# Altium footprint library USRP2_Clone.PcbLib: 91 footprints (part 1 of 6)
Each footprint in its own frame and in the unit in brackets; x right, y up, seen from the top. Pads: shape width x height; smd on the part's side, far side on the other; paste and mask are expansions set on the pad; w line width, h text height; cw(c..) or ccw(c..) is an arc to the next point about the centre after c.
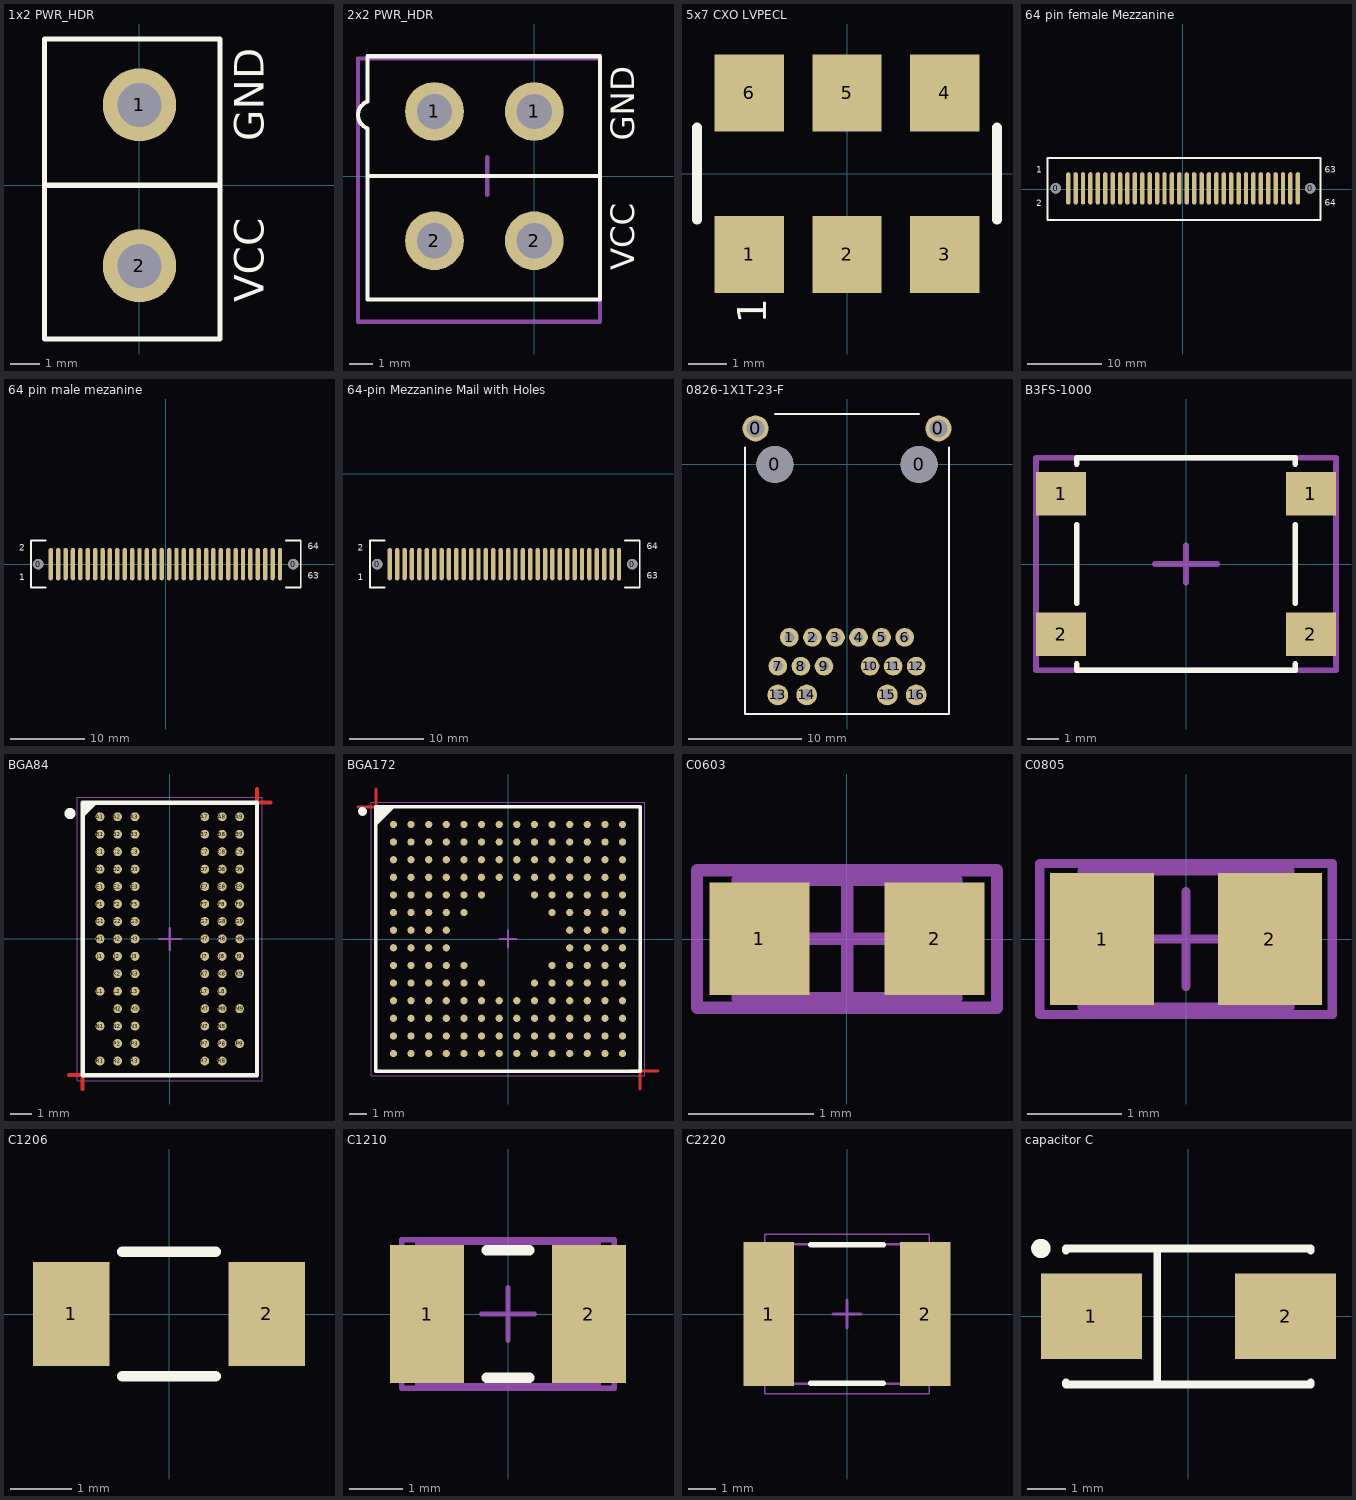
[diagram p0: the footprints below, top view; thin cyan lines are the x and y axes]

## 1x2 PWR_HDR [mm]
height 5
pads (2):
  round 2.5 hole 1.5: 1(0,2.75) 2(0,-2.75)
Top Overlay:
  lines w0.178: -3.25,0 2.75,0 ; -3.25,-5.25 -3.25,5 2.75,5 2.75,-5.25 -3.25,-5.25
  text "GND" at 4.25,1.5 h1.02
  text "VCC" at 4.25,-4 h1.02
3D body "User Library-Con_MF-xxMA.step": height 1.5, standoff -14.8, extent -3.124,-6.16 2.676,4.84

## 2x2 PWR_HDR [mm]
height 5
pads (4):
  round 2.5 hole 1.5: 1(-4.25,2.75) 1(0,2.75) 2(-4.25,-2.75) 2(0,-2.75)
Top Overlay:
  lines w0.178: -7.1,2 -7.1,-5.25 2.8,-5.25 2.8,5.1 -7.1,5.1 -7.1,3.2 ; -7.09,2.031 cw(c-6.9,2.6) -7.09,3.169 ; -7,0 2.8,0
  text "VCC" at 4.25,-4 h1.02
  text "GND" at 4.25,1.5 h1.02
Mechanical 15:
  lines w0.178: -2.7,0 -1.3,0 ; -2,-0.8 -2,0.8 ; -7.5,-6.2 2.8,-6.2 2.8,5 -7.5,5 -7.5,-6.2
3D body "User Library-Con_MF-xxMA (2).step": height 12.8, standoff -3.5, extent -7.35,-6.1 2.65,4.9

## 5x7 CXO LVPECL [mm] "6-pin 5x7 CXO LVPECL"
height 1.8
pads (6):
  rect 1.8x2 smd: 1(-2.54,-2.1) 2(0,-2.1) 3(2.54,-2.1) 4(2.54,2.1) 5(0,2.1) 6(-2.54,2.1)
Top Overlay:
  lines w0.254: -3.9,-1.2 -3.9,1.2 ; 3.9,-1.2 3.9,1.2
  text "1" at -2.1,-3.9 h0.76
3D body "7x5 CXO 6-pin.step": height 1.2, standoff 0, extent -3.502,-2.502 3.502,2.503

## 64 pin female Mezzanine [mm]
pads (66):
  round 1.4 hole 1.4 unplated mask+0: 0(-17.15,0.15) 0(17.225,0.15)
  oval 0.6x3 smd: 1(-15.45,0.825) 3(-14.452,0.832) 5(-13.454,0.832) 7(-12.453,0.832) 9(-11.452,0.832) 11(-10.454,0.832) 13(-9.453,0.832) 15(-8.452,0.832) 17(-7.454,0.832) 19(-6.453,0.832) 21(-5.453,0.832) 23(-4.452,0.832) 25(-3.454,0.832) 27(-2.453,0.832) 29(-1.452,0.832) 31(-0.454,0.832) 33(0.547,0.832) 35(1.548,0.832) 37(2.546,0.832) 39(3.547,0.832) 41(4.547,0.832) 43(5.548,0.832) 45(6.546,0.832) 47(7.547,0.832) 49(8.548,0.832) 51(9.546,0.832) 53(10.547,0.832) 55(11.548,0.832) 57(12.546,0.832) 59(13.547,0.832) 61(14.547,0.832) 63(15.548,0.832)
  oval 0.6x3 smd paste+0: 2(-15.453,-0.547) 4(-14.452,-0.547) 6(-13.454,-0.547) 8(-12.453,-0.547) 10(-11.452,-0.547) 12(-10.454,-0.547) 14(-9.453,-0.547) 16(-8.452,-0.547) 18(-7.454,-0.547) 20(-6.453,-0.547) 22(-5.453,-0.547) 24(-4.452,-0.547) 26(-3.454,-0.547) 28(-2.453,-0.547) 30(-1.452,-0.547) 32(-0.454,-0.547) 34(0.547,-0.547) 36(1.548,-0.547) 38(2.546,-0.547) 40(3.547,-0.547) 42(4.547,-0.547) 44(5.548,-0.547) 46(6.546,-0.547) 48(7.547,-0.547) 50(8.548,-0.547) 52(9.546,-0.547) 54(10.547,-0.547) 56(11.548,-0.547) 58(12.546,-0.547) 60(13.547,-0.547) 62(14.547,-0.547) 64(15.548,-0.547)
Top Overlay:
  lines w0.254: -18.247,-4.128 18.583,-4.128 18.583,4.254 -18.247,4.254 -18.247,-4.128
  text "63" at 19.175,1.95 h1.52
  text "64" at 19.175,-2.55 h1.52
  text "1" at -19.8,1.9 h1.52
  text "2" at -19.8,-2.6 h1.52
3D body "714390164.stp": height 5.31, standoff -0.79, extent -17.899,-2.923 18.001,3.177

## 64 pin male mezanine [mm]
pads (66):
  round 1.4 hole 1.4 unplated mask+0: 0(-17.25,0) 0(17.25,0)
  oval 0.6x3 smd paste+0: 1(-15.553,-0.697) 3(-14.552,-0.697) 5(-13.554,-0.697) 7(-12.553,-0.697) 9(-11.552,-0.697) 11(-10.554,-0.697) 13(-9.553,-0.697) 15(-8.552,-0.697) 17(-7.554,-0.697) 19(-6.553,-0.697) 21(-5.553,-0.697) 23(-4.552,-0.697) 25(-3.554,-0.697) 27(-2.553,-0.697) 29(-1.552,-0.697) 31(-0.554,-0.697) 33(0.447,-0.697) 35(1.448,-0.697) 37(2.446,-0.697) 39(3.447,-0.697) 41(4.447,-0.697) 43(5.448,-0.697) 45(6.446,-0.697) 47(7.447,-0.697) 49(8.448,-0.697) 51(9.446,-0.697) 53(10.447,-0.697) 55(11.448,-0.697) 57(12.446,-0.697) 59(13.447,-0.697) 61(14.447,-0.697) 63(15.448,-0.697)
  oval 0.6x3 smd: 2(-15.55,0.675) 4(-14.552,0.682) 6(-13.554,0.682) 8(-12.553,0.682) 10(-11.552,0.682) 12(-10.554,0.682) 14(-9.553,0.682) 16(-8.552,0.682) 18(-7.554,0.682) 20(-6.553,0.682) 22(-5.553,0.682) 24(-4.552,0.682) 26(-3.554,0.682) 28(-2.553,0.682) 30(-1.552,0.682) 32(-0.554,0.682) 34(0.447,0.682) 36(1.448,0.682) 38(2.446,0.682) 40(3.447,0.682) 42(4.447,0.682) 44(5.448,0.682) 46(6.446,0.682) 48(7.447,0.682) 50(8.448,0.682) 52(9.446,0.682) 54(10.447,0.682) 56(11.448,0.682) 58(12.446,0.682) 60(13.447,0.682) 62(14.447,0.682) 64(15.448,0.682)
Top Overlay:
  lines w0.254: -16.25,-3.175 -18.25,-3.175 -18.25,3.175 -16.25,3.175 ; 16.25,-3.175 18.25,-3.175 18.25,3.175 16.25,3.175
  text "64" at 19.2,1.675 h1.52
  text "63" at 19.2,-2.325 h1.52
  text "2" at -19.85,1.45 h1.52
  text "1" at -19.85,-2.55 h1.52
3D body "714362164.stp": height 8.35, standoff -0.75, extent -17.95,-3.05 17.95,3.05

## 64-pin Mezzanine Mail with Holes [mm]
height 5
pads (66):
  round 1.4 hole 1.4 unplated mask+0: 0(8.35,-12.2) 0(42.85,-12.2)
  oval 0.6x3 smd paste+0: 1(10.047,-12.897) 3(11.048,-12.897) 5(12.046,-12.897) 7(13.047,-12.897) 9(14.048,-12.897) 11(15.046,-12.897) 13(16.047,-12.897) 15(17.048,-12.897) 17(18.046,-12.897) 19(19.047,-12.897) 21(20.047,-12.897) 23(21.048,-12.897) 25(22.046,-12.897) 27(23.047,-12.897) 29(24.048,-12.897) 31(25.046,-12.897) 33(26.047,-12.897) 35(27.048,-12.897) 37(28.046,-12.897) 39(29.047,-12.897) 41(30.047,-12.897) 43(31.048,-12.897) 45(32.046,-12.897) 47(33.047,-12.897) 49(34.048,-12.897) 51(35.046,-12.897) 53(36.047,-12.897) 55(37.048,-12.897) 57(38.046,-12.897) 59(39.047,-12.897) 61(40.047,-12.897) 63(41.048,-12.897)
  oval 0.6x3 smd: 2(10.05,-11.525) 4(11.048,-11.518) 6(12.046,-11.518) 8(13.047,-11.518) 10(14.048,-11.518) 12(15.046,-11.518) 14(16.047,-11.518) 16(17.048,-11.518) 18(18.046,-11.518) 20(19.047,-11.518) 22(20.047,-11.518) 24(21.048,-11.518) 26(22.046,-11.518) 28(23.047,-11.518) 30(24.048,-11.518) 32(25.046,-11.518) 34(26.047,-11.518) 36(27.048,-11.518) 38(28.046,-11.518) 40(29.047,-11.518) 42(30.047,-11.518) 44(31.048,-11.518) 46(32.046,-11.518) 48(33.047,-11.518) 50(34.048,-11.518) 52(35.046,-11.518) 54(36.047,-11.518) 56(37.048,-11.518) 58(38.046,-11.518) 60(39.047,-11.518) 62(40.047,-11.518) 64(41.048,-11.518)
via 0,0 diameter 6 hole 3
via 52.075,10.175 diameter 6 hole 3
via 52.075,-45.725 diameter 6 hole 3
via -10.175,-45.725 diameter 6 hole 3
Top Overlay:
  lines w0.254: 9.35,-15.375 7.35,-15.375 7.35,-9.025 9.35,-9.025 ; 41.85,-15.375 43.85,-15.375 43.85,-9.025 41.85,-9.025
  text "64" at 44.8,-10.525 h1.52
  text "63" at 44.8,-14.525 h1.52
  text "2" at 5.75,-10.75 h1.52
  text "1" at 5.75,-14.75 h1.52
3D body "714362164.stp": height 8.35, standoff -0.75, extent 7.6,-15.25 43.5,-9.15

## 0826-1X1T-23-F [mil] "Gigabit Ethernet Single Port MagJack® with LEDs"
height 536
pads (20):
  round 90 hole 62: 0(-317.5,125) 0(317.5,125)
  round 128 hole 128 unplated: 0(-250,0) 0(250,0)
  round 65 hole 35: 1(-200,-600) 2(-120,-600) 3(-40,-600) 4(40,-600) 5(120,-600) 6(200,-600) 7(-240,-700) 8(-160,-700) 9(-80,-700) 10(80,-700) 11(160,-700) 12(240,-700)
  round 72 hole 40: 13(-240,-800) 14(-140,-800) 15(140,-800) 16(240,-800)
Top Overlay:
  lines w7.87: -354.33,59.06 -354.33,-866.14 354.33,-866.14 354.33,59.06 ; -250,175 250,175
3D body "User Library-RJ45-8P_1000-mag.step": height 609.25, standoff -124, extent -373.98,-859.05 373.26,427.95

## B3FS-1000 [mm] "Push Button 6x6 mm"
height 3.1
pads (4):
  rect 1.6x1.4 smd: 1(-4,2.25) 1(4,2.25) 2(-4,-2.25) 2(4,-2.25)
Top Overlay:
  lines w0.178: -3.5,-3.2 -3.5,-3.4 3.5,-3.4 3.5,-3.2 ; -3.5,-1.25 -3.5,1.25 ; -3.5,3.2 -3.5,3.4 3.5,3.4 3.5,3.2 ; 3.5,-1.25 3.5,1.25
Mechanical 15:
  lines w0.178: -1,0 1,0 ; 0,-0.6 0,0.6 ; -4.8,-3.4 -4.8,3.4 4.8,3.4 4.8,-3.4 -4.8,-3.4
3D body "Push_Button.STEP": height 5, standoff 0, extent -4.5,-3 4.5,3

## BGA84 [mm] "DDR2"
height 1.1
pads (84):
  round 0.41 smd: A1(-3.2,5.6) A2(-2.4,5.6) A3(-1.6,5.6) A7(1.6,5.6) A8(2.4,5.6) A9(3.2,5.6) B1(-3.2,4.8) B2(-2.4,4.8) B3(-1.6,4.8) B7(1.6,4.8) B8(2.4,4.8) B9(3.2,4.8) C1(-3.2,4) C2(-2.4,4) C3(-1.6,4) C7(1.6,4) C8(2.4,4) C9(3.2,4) D1(-3.2,3.2) D2(-2.4,3.2) D3(-1.6,3.2) D7(1.6,3.2) D8(2.4,3.2) D9(3.2,3.2) E1(-3.2,2.4) E2(-2.4,2.4) E3(-1.6,2.4) E7(1.6,2.4) E8(2.4,2.4) E9(3.2,2.4) F1(-3.2,1.6) F2(-2.4,1.6) F3(-1.6,1.6) F7(1.6,1.6) F8(2.4,1.6) F9(3.2,1.6) G1(-3.2,0.8) G2(-2.4,0.8) G3(-1.6,0.8) G7(1.6,0.8) G8(2.4,0.8) G9(3.2,0.8) H1(-3.2,0) H2(-2.4,0) H3(-1.6,0) H7(1.6,0) H8(2.4,0) H9(3.2,0) J1(-3.2,-0.8) J2(-2.4,-0.8) J3(-1.6,-0.8) J7(1.6,-0.8) J8(2.4,-0.8) J9(3.2,-0.8) K2(-2.4,-1.6) K3(-1.6,-1.6) K7(1.6,-1.6) K8(2.4,-1.6) K9(3.2,-1.6) L1(-3.2,-2.4) L2(-2.4,-2.4) L3(-1.6,-2.4) L7(1.6,-2.4) L8(2.4,-2.4) M2(-2.4,-3.2) M3(-1.6,-3.2) M7(1.6,-3.2) M8(2.4,-3.2) M9(3.2,-3.2) N1(-3.2,-4) N2(-2.4,-4) N3(-1.6,-4) N7(1.6,-4) N8(2.4,-4) P2(-2.4,-4.8) P3(-1.6,-4.8) P7(1.6,-4.8) P8(2.4,-4.8) P9(3.2,-4.8) R1(-3.2,-5.6) R2(-2.4,-5.6) R3(-1.6,-5.6) R7(1.6,-5.6) R8(2.4,-5.6)
Top Layer:
  lines w0.178: -4.635,-6.25 -4.01,-6.25 ; -4,-6.885 -4,-6.26 ; 4,6.875 4,6.25 4.625,6.25
Top Overlay:
  circle w0.25: c-4.575,5.75 r0.125
  region: -3.406,6.25 -4,5.656 -4,6.25
  lines w0.2: -4,5.656 -3.406,6.25 ; -4,-6.25 4,-6.25 4,6.25 -4,6.25 -4,-6.25
Mechanical 13:
  lines w0.1: -4,-6.25 4,-6.25 4,6.25 -4,6.25 -4,-6.25
Mechanical 15:
  lines w0.05: -4.25,-6.5 4.25,-6.5 4.25,6.5 -4.25,6.5 -4.25,-6.5
  lines w0.1: -0.5,0 0.5,0 ; 0,-0.5 0,0.5
3D body "User Library-BGA84_8M0X12M5.step": height 1.11, standoff 0, extent -4,-6.25 4,6.25

## BGA172 [mm] "BGA, 172-Leads, Body 15,00x15,00mmx0,53mm, Pitch 1,00mm"
height 0.53
pads (172):
  round 0.41 smd: A1(-6.5,6.5) A2(-5.5,6.5) A3(-4.5,6.5) A4(-3.5,6.5) A5(-2.5,6.5) A6(-1.5,6.5) A7(-0.5,6.5) A8(0.5,6.5) A9(1.5,6.5) A10(2.5,6.5) A11(3.5,6.5) A12(4.5,6.5) A13(5.5,6.5) A14(6.5,6.5) B1(-6.5,5.5) B2(-5.5,5.5) B3(-4.5,5.5) B4(-3.5,5.5) B5(-2.5,5.5) B6(-1.5,5.5) B7(-0.5,5.5) B8(0.5,5.5) B9(1.5,5.5) B10(2.5,5.5) B11(3.5,5.5) B12(4.5,5.5) B13(5.5,5.5) B14(6.5,5.5) C1(-6.5,4.5) C2(-5.5,4.5) C3(-4.5,4.5) C4(-3.5,4.5) C5(-2.5,4.5) C6(-1.5,4.5) C7(-0.5,4.5) C8(0.5,4.5) C9(1.5,4.5) C10(2.5,4.5) C11(3.5,4.5) C12(4.5,4.5) C13(5.5,4.5) C14(6.5,4.5) D1(-6.5,3.5) D2(-5.5,3.5) D3(-4.5,3.5) D4(-3.5,3.5) D5(-2.5,3.5) D6(-1.5,3.5) D7(-0.5,3.5) D8(0.5,3.5) D9(1.5,3.5) D10(2.5,3.5) D11(3.5,3.5) D12(4.5,3.5) D13(5.5,3.5) D14(6.5,3.5) E1(-6.5,2.5) E2(-5.5,2.5) E3(-4.5,2.5) E4(-3.5,2.5) E5(-2.5,2.5) E6(-1.5,2.5) E9(1.5,2.5) E10(2.5,2.5) E11(3.5,2.5) E12(4.5,2.5) E13(5.5,2.5) E14(6.5,2.5) F1(-6.5,1.5) F2(-5.5,1.5) F3(-4.5,1.5) F4(-3.5,1.5) F5(-2.5,1.5) F10(2.5,1.5) F11(3.5,1.5) F12(4.5,1.5) F13(5.5,1.5) F14(6.5,1.5) G1(-6.5,0.5) G2(-5.5,0.5) G3(-4.5,0.5) G4(-3.5,0.5) G11(3.5,0.5) G12(4.5,0.5) G13(5.5,0.5) G14(6.5,0.5) H1(-6.5,-0.5) H2(-5.5,-0.5) H3(-4.5,-0.5) H4(-3.5,-0.5) H11(3.5,-0.5) H12(4.5,-0.5) H13(5.5,-0.5) H14(6.5,-0.5) J1(-6.5,-1.5) J2(-5.5,-1.5) J3(-4.5,-1.5) J4(-3.5,-1.5) J5(-2.5,-1.5) J10(2.5,-1.5) J11(3.5,-1.5) J12(4.5,-1.5) J13(5.5,-1.5) J14(6.5,-1.5) K1(-6.5,-2.5) K2(-5.5,-2.5) K3(-4.5,-2.5) K4(-3.5,-2.5) K5(-2.5,-2.5) K6(-1.5,-2.5) K9(1.5,-2.5) K10(2.5,-2.5) K11(3.5,-2.5) K12(4.5,-2.5) K13(5.5,-2.5) K14(6.5,-2.5) L1(-6.5,-3.5) L2(-5.5,-3.5) L3(-4.5,-3.5) L4(-3.5,-3.5) L5(-2.5,-3.5) L6(-1.5,-3.5) L7(-0.5,-3.5) L8(0.5,-3.5) L9(1.5,-3.5) L10(2.5,-3.5) L11(3.5,-3.5) L12(4.5,-3.5) L13(5.5,-3.5) L14(6.5,-3.5) M1(-6.5,-4.5) M2(-5.5,-4.5) M3(-4.5,-4.5) M4(-3.5,-4.5) M5(-2.5,-4.5) M6(-1.5,-4.5) M7(-0.5,-4.5) M8(0.5,-4.5) M9(1.5,-4.5) M10(2.5,-4.5) M11(3.5,-4.5) M12(4.5,-4.5) M13(5.5,-4.5) M14(6.5,-4.5) N1(-6.5,-5.5) N2(-5.5,-5.5) N3(-4.5,-5.5) N4(-3.5,-5.5) N5(-2.5,-5.5) N6(-1.5,-5.5) N7(-0.5,-5.5) N8(0.5,-5.5) N9(1.5,-5.5) N10(2.5,-5.5) N11(3.5,-5.5) N12(4.5,-5.5) N13(5.5,-5.5) N14(6.5,-5.5) P1(-6.5,-6.5) P2(-5.5,-6.5) P3(-4.5,-6.5) P4(-3.5,-6.5) P5(-2.5,-6.5) P6(-1.5,-6.5) P7(-0.5,-6.5) P8(0.5,-6.5) P9(1.5,-6.5) P10(2.5,-6.5) P11(3.5,-6.5) P12(4.5,-6.5) P13(5.5,-6.5) P14(6.5,-6.5)
Top Layer:
  lines w0.178: -8.509,7.493 -6.985,7.493 ; -7.493,6.985 -7.493,8.509 ; 6.985,-7.493 8.509,-7.493 ; 7.493,-8.509 7.493,-6.985
Top Overlay:
  circle w0.25: c-8.255,7.239 r0.125
  region: -6.5,7.5 -7.5,6.5 -7.5,7.5
  lines w0.2: -7.5,6.5 -6.5,7.5 ; -7.5,-7.5 7.5,-7.5 7.5,7.5 -7.5,7.5 -7.5,-7.5
Mechanical 13:
  lines w0.1: -7.5,-7.5 7.5,-7.5 7.5,7.5 -7.5,7.5 -7.5,-7.5
Mechanical 15:
  lines w0.05: -7.75,-7.75 7.75,-7.75 7.75,7.75 -7.75,7.75 -7.75,-7.75
  lines w0.1: -0.5,0 0.5,0 ; 0,-0.5 0,0.5
3D body: height 0.53, standoff 0.26, extent -7.5,-7.5 7.5,7.5

## C0603 [mm] "Chip Capacitor, Body 1.6x0.8mm, IPC High Density"
height 1.3
pads (2):
  rect 0.8x0.9 smd: 1(-0.7,0) 2(0.7,0)
Mechanical 13:
  lines w0.1: -0.875,-0.475 -0.875,0.475 0.875,0.475 0.875,-0.475 -0.875,-0.475
Mechanical 15:
  lines w0.1: -0.475,0 0.475,0 ; 0,-0.475 0,0.475 ; -1.2,-0.55 -1.2,0.55 1.2,0.55 1.2,-0.55 -1.2,-0.55
3D body "0603-SMD CAPACITOR.step": height 0.79, standoff -0.01, extent -0.8,-0.4 0.8,0.4

## C0805 [mm] "Chip Capacitor, Body 2.0x1.3mm, IPC High Density"
height 1.4
pads (2):
  rect 1.1x1.4 smd: 1(-0.889,0) 2(0.889,0)
Mechanical 13:
  lines w0.1: -1.1,-0.725 1.1,-0.725 1.1,0.725 -1.1,0.725 -1.1,-0.725
Mechanical 15:
  lines w0.1: -0.5,0 0.5,0 ; 0,-0.5 0,0.5 ; -1.55,-0.8 1.55,-0.8 1.55,0.8 -1.55,0.8 -1.55,-0.8
3D body "0805-SMD CAPACITOR.step": height 0.59, standoff -0.01, extent -1,-0.625 1,0.625

## C1206 [mm]
height 0.5
pads (2):
  rect 1.25x1.7 smd: 1(-1.6,0) 2(1.6,0)
Top Overlay:
  lines w0.178: -0.762,-1.016 0.762,-1.016 ; -0.762,1.016 0.762,1.016
3D body "1206_SMD CAPACITOR.step": height 0.77, standoff -0.01, extent -1.6,-0.8 1.6,0.8

## C1210 [mm] "Chip Capacitor, Body 3.2x2.5mm, IPC High Density"
height 1.3
pads (2):
  rect 1.4x2.6 smd: 1(-1.524,0) 2(1.524,0)
Top Overlay:
  lines w0.2: -0.4,-1.2 0.4,-1.2 ; -0.4,1.2 0.4,1.2
Mechanical 13:
  lines w0.1: -1.7,-1.35 -1.7,1.35 1.7,1.35 1.7,-1.35 -1.7,-1.35
Mechanical 15:
  lines w0.1: -0.5,0 0.5,0 ; 0,-0.5 0,0.5 ; -2,-1.4 -2,1.4 2,1.4 2,-1.4 -2,-1.4
3D body "1210-SMD CAPACITOR.step": height 0.77, standoff -0.01, extent -1.6,-1.25 1.6,1.25

## C2220 [mm] "Chip Capacitor"
height 2.5
pads (2):
  rect 1.8x5.15 smd: 1(-2.8,0) 2(2.8,0)
Top Overlay:
  lines w0.2: -1.3,-2.475 1.3,-2.475 ; -1.3,2.475 1.3,2.475
Mechanical 13:
  lines w0.1: -2.25,-2.5 2.25,-2.5 2.25,2.5 -2.25,2.5 -2.25,-2.5
Mechanical 15:
  lines w0.05: -2.95,-2.85 2.95,-2.85 2.95,2.85 -2.95,2.85 -2.95,-2.85
  lines w0.1: -0.5,0 0.5,0 ; 0,-0.5 0,0.5
3D body "User Library-SMD CAPACITOR_2220.step": height 1, standoff 0, extent -2.8,-2.5 2.8,2.5

## capacitor C [mm]
pads (2):
  rect 2.6x2.2 smd: 1(-2.5,0) 2(2.5,0)
Top Overlay:
  circle w0.25: c-3.8,1.75 r0.125
  lines w0.2: -3.15,-1.7 -3.15,-1.75 3.15,-1.75 3.15,-1.7 ; -3.15,1.7 -3.15,1.75 3.15,1.75 3.15,1.7 ; -0.8,-1.75 -0.8,1.75
3D body "User_Library-Tantalum_Size_C.step": height 2.6, standoff 0, extent -2.9,-1.55 2.9,1.65